# Altium footprint library 车载定位器.PcbLib: 2 footprints
Each footprint in its own frame and in the unit in brackets; x right, y up, seen from the top. Pads: shape width x height; smd on the part's side, far side on the other; paste and mask are expansions set on the pad; w line width, h text height; cw(c..) or ccw(c..) is an arc to the next point about the centre after c.
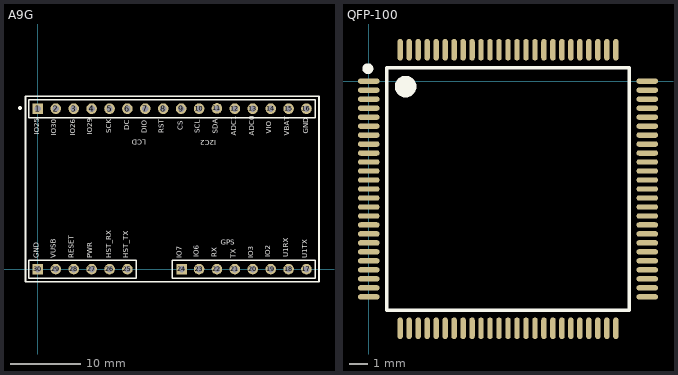
[diagram p0: the footprints below, top view; thin cyan lines are the x and y axes]

## A9G [mm] "A9G模组"
pads (30):
  rect 1.5x1.5 hole 0.9: 1(0,22.765) 24(20.392,0) 30(0,0)
  round 1.5 hole 0.9: 2(2.54,22.765) 3(5.08,22.765) 4(7.62,22.765) 5(10.16,22.765) 6(12.7,22.765) 7(15.24,22.765) 8(17.78,22.765) 9(20.32,22.765) 10(22.86,22.765) 11(25.4,22.795) 12(27.94,22.765) 13(30.48,22.765) 14(33.02,22.765) 15(35.56,22.765) 16(38.1,22.765) 17(38.1,0) 18(35.56,0) 19(33.02,0) 20(30.48,0) 21(27.94,0) 22(25.4,0) 23(22.86,0) 25(12.7,0) 26(10.16,0) 27(7.62,0) 28(5.08,0) 29(2.54,0)
Top Overlay:
  circle w0.254: c-2.54,22.86 r0.141
  lines w0.2: -1.27,-1.27 -1.27,1.27 13.97,1.27 13.97,-1.27 -1.27,-1.27 ; -1.27,21.463 -1.27,24.003 39.37,24.003 39.37,21.463 -1.27,21.463 ; 19.05,-1.27 39.37,-1.27 39.37,1.27 19.05,1.27 19.05,-1.27
  lines w0.254: -1.778,-1.778 -1.778,24.511 39.878,24.511 39.878,-1.778 -1.778,-1.778
  text "IO25" at 0.508,19.05 h1.2
  text "IO30" at 2.921,18.923 h1.2
  text "IO26" at 5.588,18.923 h1.2
  text "IO29" at 8.001,19.05 h1.2
  text "LCD" at 15.367,18.669 h1.2
  text "DC" at 13.208,19.685 h1.2
  text "ADC1" at 28.448,18.923 h1.2
  text "SDA" at 25.781,19.177 h1.2
  text "SCL" at 23.241,19.304 h1.2
  text "CS" at 20.828,19.685 h1.2
  text "RST" at 18.161,19.304 h1.2
  text "DIO" at 15.748,19.304 h1.2
  text "ADC0" at 30.988,18.923 h1.2
  text "VIO" at 33.401,19.177 h1.2
  text "VBAT" at 35.941,18.923 h1.2
  text "GND" at 38.608,19.177 h1.2
  text "GND" at 0.381,1.524 h1.2
  text "VUSB" at 2.794,1.524 h1.2
  text "RESET" at 5.334,1.524 h1.2
  text "PWR" at 8.001,1.524 h1.2
  text "HST_RX" at 10.668,1.524 h1.2
  text "HST_TX" at 13.081,1.524 h1.2
  text "IO7" at 20.701,1.524 h1.2
  text "IO6" at 23.114,1.651 h1.2
  text "RX" at 25.654,1.651 h1.2
  text "TX" at 28.321,1.524 h1.2
  text "IO3" at 30.861,1.524 h1.2
  text "IO2" at 33.274,1.651 h1.2
  text "U1RX" at 35.814,1.651 h1.2
  text "U1TX" at 38.481,1.524 h1.2
  text "SCK" at 10.668,19.304 h1.2
  text "I2C2" at 25.273,18.542 h1.2
  text "GPS" at 25.908,3.175 h1.2
3D body "1001-6.STEP": height 8.54, standoff -3, extent -1.27,-1.27 13.97,1.27
3D body "1001-8.STEP": height 8.54, standoff -3, extent 19.122,-1.27 39.442,1.27
3D body "HDR1x16.STEP": height 8.54, standoff -3, extent -1.27,21.463 39.37,24.003

## QFP-100 [mm] "LSA16.20-LSB16.20-PITCH0.50-TL"
pads (100):
  oval 1.2x0.3 smd: 1(-0.003,0.012) 2(-0.003,-0.488) 3(-0.003,-0.988) 4(-0.003,-1.488) 5(-0.003,-1.988) 6(-0.003,-2.488) 7(-0.003,-2.988) 8(-0.003,-3.488) 9(-0.003,-3.988) 10(-0.003,-4.488) 11(-0.003,-4.988) 12(-0.003,-5.488) 13(-0.003,-5.988) 14(-0.003,-6.488) 15(-0.003,-6.988) 16(-0.003,-7.488) 17(-0.003,-7.988) 18(-0.003,-8.488) 19(-0.003,-8.988) 20(-0.003,-9.488) 21(-0.003,-9.988) 22(-0.003,-10.488) 23(-0.003,-10.988) 24(-0.003,-11.488) 25(-0.003,-11.988) 51(15.497,-11.988) 52(15.497,-11.488) 53(15.497,-10.988) 54(15.497,-10.488) 55(15.497,-9.988) 56(15.497,-9.488) 57(15.497,-8.988) 58(15.497,-8.488) 59(15.497,-7.988) 60(15.497,-7.488) 61(15.497,-6.988) 62(15.497,-6.488) 63(15.497,-5.988) 64(15.497,-5.488) 65(15.497,-4.988) 66(15.497,-4.488) 67(15.497,-3.988) 68(15.497,-3.488) 69(15.497,-2.988) 70(15.497,-2.488) 71(15.497,-1.988) 72(15.497,-1.488) 73(15.497,-0.988) 74(15.497,-0.488) 75(15.497,0.012)
  oval 0.3x1.2 smd: 26(1.747,-13.738) 27(2.247,-13.738) 28(2.747,-13.738) 29(3.247,-13.738) 30(3.747,-13.738) 31(4.247,-13.738) 32(4.747,-13.738) 33(5.247,-13.738) 34(5.747,-13.738) 35(6.247,-13.738) 36(6.747,-13.738) 37(7.247,-13.738) 38(7.747,-13.738) 39(8.247,-13.738) 40(8.747,-13.738) 41(9.247,-13.738) 42(9.747,-13.738) 43(10.247,-13.738) 44(10.747,-13.738) 45(11.247,-13.738) 46(11.747,-13.738) 47(12.247,-13.738) 48(12.747,-13.738) 49(13.247,-13.738) 50(13.747,-13.738) 76(13.747,1.762) 77(13.247,1.762) 78(12.747,1.762) 79(12.247,1.762) 80(11.747,1.762) 81(11.247,1.762) 82(10.747,1.762) 83(10.247,1.762) 84(9.747,1.762) 85(9.247,1.762) 86(8.747,1.762) 87(8.247,1.762) 88(7.747,1.762) 89(7.247,1.762) 90(6.747,1.762) 91(6.247,1.762) 92(5.747,1.762) 93(5.247,1.762) 94(4.747,1.762) 95(4.247,1.762) 96(3.747,1.762) 97(3.247,1.762) 98(2.747,1.762) 99(2.247,1.762) 100(1.747,1.762)
Top Overlay:
  lines w0.2: 0.997,-12.738 14.497,-12.738 14.497,0.762 0.997,0.762 0.997,-12.738
  lines w0.3: 0.097,0.711 cw(c-0.053,0.712) 0.097,0.713
  lines w0.6: 2.347,-0.291 cw(c2.047,-0.288) 2.347,-0.285